# Altium footprint library ParsaLibrary.PcbLib: 526 footprints (part 20 of 33)
Each footprint in its own frame and in the unit in brackets; x right, y up, seen from the top. Pads: shape width x height; smd on the part's side, far side on the other; paste and mask are expansions set on the pad; w line width, h text height; cw(c..) or ccw(c..) is an arc to the next point about the centre after c.
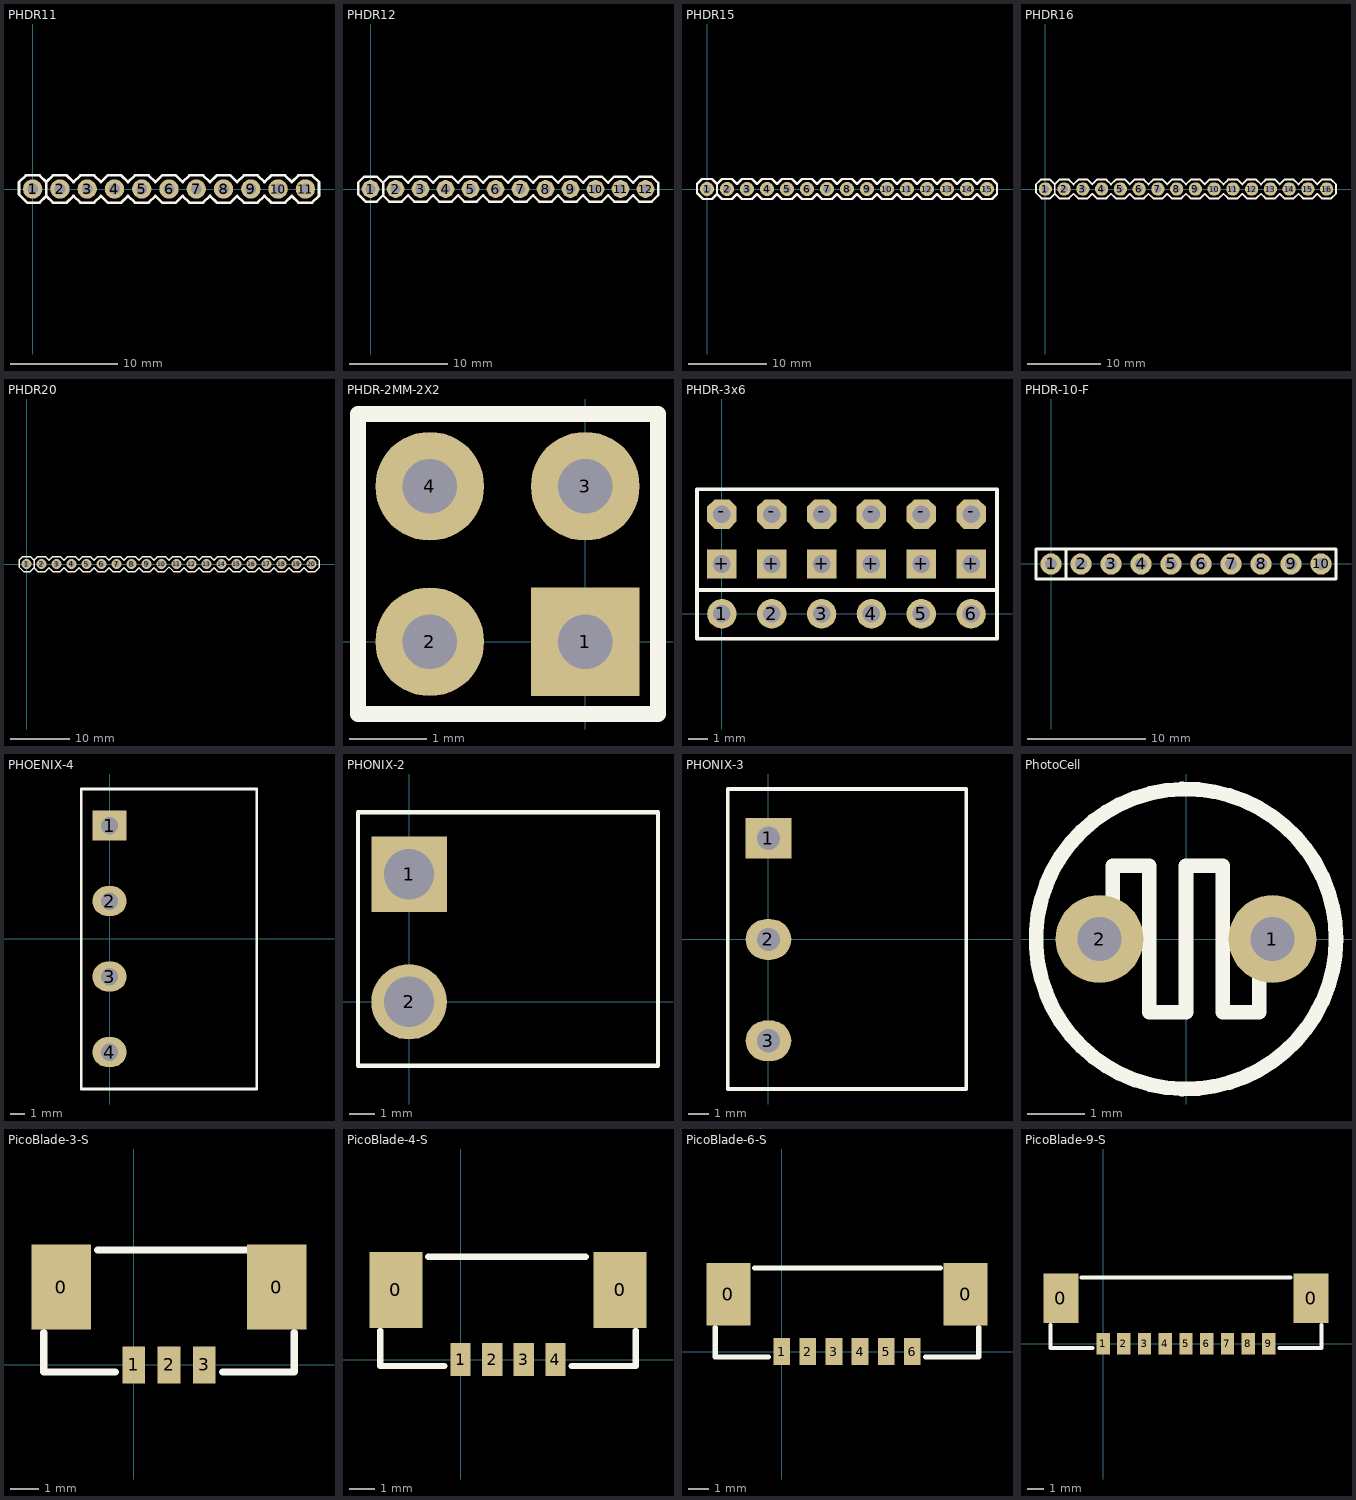
[diagram p19: the footprints below, top view; thin cyan lines are the x and y axes]

## PHDR11 [mm]
pads (11):
  round 1.8 hole 1: 1(0,0) 2(2.54,0) 3(5.08,0) 4(7.62,0) 5(10.16,0) 6(12.7,0) 7(15.24,0) 8(17.78,0) 9(20.32,0) 10(22.86,0) 11(25.4,0)
Top Overlay:
  lines w0.254: 4.572,-1.27 5.715,-1.27 6.35,-0.635 6.985,-1.27 7.62,-1.27 ; 5.08,-1.27 4.445,-1.27 3.81,-0.635 3.175,-1.27 2.54,-1.27 1.905,-1.27 1.27,-0.635 ; 14.732,-1.27 15.875,-1.27 16.51,-0.635 17.145,-1.27 17.78,-1.27 ; 15.24,-1.27 14.605,-1.27 13.97,-0.635 13.335,-1.27 12.7,-1.27 ; 1.27,-0.635 0.635,-1.27 -0.508,-1.27 -1.27,-0.508 -1.27,0.635 -0.635,1.27 0.635,1.27 1.27,0.635 ; 1.27,-0.635 1.27,0.635 ; 1.27,0.635 1.905,1.27 3.175,1.27 3.81,0.635 4.445,1.27 5.715,1.27 6.35,0.635 6.985,1.27 8.255,1.27 8.89,0.635 9.525,1.27 10.795,1.27 11.43,0.635 12.065,1.27 13.335,1.27 13.97,0.635 14.605,1.27 15.875,1.27 16.51,0.635 17.145,1.27 18.415,1.27 19.05,0.635 19.685,1.27 20.955,1.27 21.59,0.635 22.225,1.27 23.495,1.27 24.13,0.635 24.765,1.27 26.035,1.27 26.67,0.635 26.67,-0.635 26.035,-1.27 25.4,-1.27 24.765,-1.27 24.13,-0.635 23.495,-1.27 22.86,-1.27 22.225,-1.27 21.59,-0.635 20.955,-1.27 20.32,-1.27 19.685,-1.27 19.05,-0.635 18.415,-1.27 ; 7.62,-1.27 8.255,-1.27 ; 7.62,-1.27 8.255,-1.27 ; 8.255,-1.27 8.89,-0.635 9.525,-1.27 10.16,-1.27 10.795,-1.27 11.43,-0.635 12.065,-1.27 ; 12.065,-1.27 12.7,-1.27 ; 12.065,-1.27 12.7,-1.27 ; 17.78,-1.27 18.415,-1.27 ; 17.78,-1.27 18.415,-1.27
3D body "2pinheader.STEP": height 0.84, standoff -10.08, extent 19.05,-1.27 24.13,1.27
3D body "2pinheader.STEP": height 0.84, standoff -10.08, extent 13.97,-1.27 19.05,1.27
3D body "2pinheader.STEP": height 0.84, standoff -10.08, extent 8.89,-1.27 13.97,1.27
3D body "2pinheader.STEP": height 0.84, standoff -10.08, extent 3.81,-1.27 8.89,1.27
3D body "2pinheader.STEP": height 0.74, standoff -10.18, extent -1.27,-1.27 3.81,1.27
3D body "2pinheader.STEP": height 0.84, standoff -10.08, extent 21.59,-1.27 26.67,1.27

## PHDR12 [mm]
pads (12):
  round 1.8 hole 1: 1(0,0) 2(2.54,0) 3(5.08,0) 4(7.62,0) 5(10.16,0) 6(12.7,0) 7(15.24,0) 8(17.78,0) 9(20.32,0) 10(22.86,0) 11(25.4,0) 12(27.94,0)
Top Overlay:
  lines w0.254: 4.572,-1.27 5.715,-1.27 6.35,-0.635 6.985,-1.27 7.62,-1.27 ; 5.08,-1.27 4.445,-1.27 3.81,-0.635 3.175,-1.27 2.54,-1.27 1.905,-1.27 1.27,-0.635 ; 14.732,-1.27 15.875,-1.27 16.51,-0.635 17.145,-1.27 17.78,-1.27 ; 15.24,-1.27 14.605,-1.27 13.97,-0.635 13.335,-1.27 12.7,-1.27 ; 1.27,-0.635 1.27,0.635 ; 1.27,-0.635 0.635,-1.27 -0.508,-1.27 -1.27,-0.508 -1.27,0.635 -0.635,1.27 0.635,1.27 1.27,0.635 ; 1.27,0.635 1.905,1.27 3.175,1.27 3.81,0.635 4.445,1.27 5.715,1.27 6.35,0.635 6.985,1.27 8.255,1.27 8.89,0.635 9.525,1.27 10.795,1.27 11.43,0.635 12.065,1.27 13.335,1.27 13.97,0.635 14.605,1.27 15.875,1.27 16.51,0.635 17.145,1.27 18.415,1.27 19.05,0.635 19.685,1.27 20.955,1.27 21.59,0.635 22.225,1.27 23.495,1.27 24.13,0.635 24.765,1.27 26.035,1.27 26.67,0.635 27.305,1.27 28.575,1.27 29.21,0.635 29.21,-0.635 28.575,-1.27 27.94,-1.27 27.305,-1.27 26.67,-0.635 26.035,-1.27 25.4,-1.27 24.765,-1.27 24.13,-0.635 23.495,-1.27 22.86,-1.27 22.225,-1.27 21.59,-0.635 20.955,-1.27 20.32,-1.27 19.685,-1.27 19.05,-0.635 18.415,-1.27 ; 7.62,-1.27 8.255,-1.27 ; 7.62,-1.27 8.255,-1.27 ; 8.255,-1.27 8.89,-0.635 9.525,-1.27 10.16,-1.27 10.795,-1.27 11.43,-0.635 12.065,-1.27 ; 12.065,-1.27 12.7,-1.27 ; 12.065,-1.27 12.7,-1.27 ; 17.78,-1.27 18.415,-1.27 ; 17.78,-1.27 18.415,-1.27
3D body "2pinheader.STEP": height 0.84, standoff -10.08, extent 24.13,-1.27 29.21,1.27
3D body "2pinheader.STEP": height 0.74, standoff -10.18, extent -1.27,-1.27 3.81,1.27
3D body "2pinheader.STEP": height 0.84, standoff -10.08, extent 3.81,-1.27 8.89,1.27
3D body "2pinheader.STEP": height 0.84, standoff -10.08, extent 8.89,-1.27 13.97,1.27
3D body "2pinheader.STEP": height 0.84, standoff -10.08, extent 13.97,-1.27 19.05,1.27
3D body "2pinheader.STEP": height 0.84, standoff -10.08, extent 19.05,-1.27 24.13,1.27

## PHDR15 [mm]
pads (15):
  round 1.8 hole 1: 1(0,0) 2(2.54,0) 3(5.08,0) 4(7.62,0) 5(10.16,0) 6(12.7,0) 7(15.24,0) 8(17.78,0) 9(20.32,0) 10(22.86,0) 11(25.4,0) 12(27.94,0) 13(30.48,0) 14(33.02,0) 15(35.56,0)
Top Overlay:
  lines w0.254: 4.572,-1.27 5.715,-1.27 6.35,-0.635 6.985,-1.27 7.62,-1.27 ; 5.08,-1.27 4.445,-1.27 3.81,-0.635 3.175,-1.27 2.54,-1.27 1.905,-1.27 1.27,-0.635 ; 14.732,-1.27 15.875,-1.27 16.51,-0.635 17.145,-1.27 17.78,-1.27 ; 15.24,-1.27 14.605,-1.27 13.97,-0.635 13.335,-1.27 12.7,-1.27 ; 29.972,-1.27 31.115,-1.27 31.75,-0.635 32.385,-1.27 33.02,-1.27 ; 30.48,-1.27 29.845,-1.27 29.21,-0.635 28.575,-1.27 27.94,-1.27 27.305,-1.27 26.67,-0.635 26.035,-1.27 25.4,-1.27 24.765,-1.27 24.13,-0.635 23.495,-1.27 22.86,-1.27 22.225,-1.27 21.59,-0.635 20.955,-1.27 20.32,-1.27 19.685,-1.27 19.05,-0.635 18.415,-1.27 ; 1.27,-0.635 0.635,-1.27 -0.508,-1.27 -1.27,-0.508 -1.27,0.635 -0.635,1.27 0.635,1.27 1.27,0.635 ; 1.27,-0.635 1.27,0.635 ; 1.27,0.635 1.905,1.27 3.175,1.27 3.81,0.635 4.445,1.27 5.715,1.27 6.35,0.635 6.985,1.27 8.255,1.27 8.89,0.635 9.525,1.27 10.795,1.27 11.43,0.635 12.065,1.27 13.335,1.27 13.97,0.635 14.605,1.27 15.875,1.27 16.51,0.635 17.145,1.27 18.415,1.27 19.05,0.635 19.685,1.27 20.955,1.27 21.59,0.635 22.225,1.27 23.495,1.27 24.13,0.635 24.765,1.27 26.035,1.27 26.67,0.635 27.305,1.27 28.575,1.27 29.21,0.635 29.845,1.27 31.115,1.27 31.75,0.635 32.385,1.27 33.655,1.27 34.29,0.635 34.925,1.27 36.195,1.27 36.83,0.635 36.83,-0.635 36.195,-1.27 35.56,-1.27 34.925,-1.27 34.29,-0.635 33.655,-1.27 ; 7.62,-1.27 8.255,-1.27 ; 7.62,-1.27 8.255,-1.27 ; 8.255,-1.27 8.89,-0.635 9.525,-1.27 10.16,-1.27 10.795,-1.27 11.43,-0.635 12.065,-1.27 ; 12.065,-1.27 12.7,-1.27 ; 12.065,-1.27 12.7,-1.27 ; 17.78,-1.27 18.415,-1.27 ; 17.78,-1.27 18.415,-1.27 ; 33.02,-1.27 33.655,-1.27 ; 33.02,-1.27 33.655,-1.27
3D body "2pinheader.STEP": height 0.84, standoff -10.08, extent 29.21,-1.27 34.29,1.27
3D body "2pinheader.STEP": height 0.84, standoff -10.08, extent 31.75,-1.27 36.83,1.27
3D body "2pinheader.STEP": height 0.84, standoff -10.08, extent 19.05,-1.27 24.13,1.27
3D body "2pinheader.STEP": height 0.84, standoff -10.08, extent 13.97,-1.27 19.05,1.27
3D body "2pinheader.STEP": height 0.84, standoff -10.08, extent 8.89,-1.27 13.97,1.27
3D body "2pinheader.STEP": height 0.84, standoff -10.08, extent 3.81,-1.27 8.89,1.27
3D body "2pinheader.STEP": height 0.74, standoff -10.18, extent -1.27,-1.27 3.81,1.27
3D body "2pinheader.STEP": height 0.84, standoff -10.08, extent 24.13,-1.27 29.21,1.27

## PHDR16 [mm]
pads (16):
  round 1.8 hole 1: 1(0,0) 2(2.54,0) 3(5.08,0) 4(7.62,0) 5(10.16,0) 6(12.7,0) 7(15.24,0) 8(17.78,0) 9(20.32,0) 10(22.86,0) 11(25.4,0) 12(27.94,0) 13(30.48,0) 14(33.02,0) 15(35.56,0) 16(38.1,0)
Top Overlay:
  lines w0.254: 4.572,-1.27 5.715,-1.27 6.35,-0.635 6.985,-1.27 7.62,-1.27 ; 5.08,-1.27 4.445,-1.27 3.81,-0.635 3.175,-1.27 2.54,-1.27 1.905,-1.27 1.27,-0.635 ; 14.732,-1.27 15.875,-1.27 16.51,-0.635 17.145,-1.27 17.78,-1.27 ; 15.24,-1.27 14.605,-1.27 13.97,-0.635 13.335,-1.27 12.7,-1.27 ; 29.972,-1.27 31.115,-1.27 31.75,-0.635 32.385,-1.27 33.02,-1.27 ; 30.48,-1.27 29.845,-1.27 29.21,-0.635 28.575,-1.27 27.94,-1.27 27.305,-1.27 26.67,-0.635 26.035,-1.27 25.4,-1.27 24.765,-1.27 24.13,-0.635 23.495,-1.27 22.86,-1.27 22.225,-1.27 21.59,-0.635 20.955,-1.27 20.32,-1.27 19.685,-1.27 19.05,-0.635 18.415,-1.27 ; 1.27,-0.635 1.27,0.635 ; 1.27,-0.635 0.635,-1.27 -0.508,-1.27 -1.27,-0.508 -1.27,0.635 -0.635,1.27 0.635,1.27 1.27,0.635 ; 1.27,0.635 1.905,1.27 3.175,1.27 3.81,0.635 4.445,1.27 5.715,1.27 6.35,0.635 6.985,1.27 8.255,1.27 8.89,0.635 9.525,1.27 10.795,1.27 11.43,0.635 12.065,1.27 13.335,1.27 13.97,0.635 14.605,1.27 15.875,1.27 16.51,0.635 17.145,1.27 18.415,1.27 19.05,0.635 19.685,1.27 20.955,1.27 21.59,0.635 22.225,1.27 23.495,1.27 24.13,0.635 24.765,1.27 26.035,1.27 26.67,0.635 27.305,1.27 28.575,1.27 29.21,0.635 29.845,1.27 31.115,1.27 31.75,0.635 32.385,1.27 33.655,1.27 34.29,0.635 34.925,1.27 36.195,1.27 36.83,0.635 37.465,1.27 38.735,1.27 39.37,0.635 39.37,-0.635 38.735,-1.27 38.1,-1.27 37.465,-1.27 36.83,-0.635 36.195,-1.27 35.56,-1.27 34.925,-1.27 34.29,-0.635 33.655,-1.27 ; 7.62,-1.27 8.255,-1.27 ; 7.62,-1.27 8.255,-1.27 ; 8.255,-1.27 8.89,-0.635 9.525,-1.27 10.16,-1.27 10.795,-1.27 11.43,-0.635 12.065,-1.27 ; 12.065,-1.27 12.7,-1.27 ; 12.065,-1.27 12.7,-1.27 ; 17.78,-1.27 18.415,-1.27 ; 17.78,-1.27 18.415,-1.27 ; 33.02,-1.27 33.655,-1.27 ; 33.02,-1.27 33.655,-1.27
3D body "2pinheader.STEP": height 0.84, standoff -10.08, extent 24.13,-1.27 29.21,1.27
3D body "2pinheader.STEP": height 0.74, standoff -10.18, extent -1.27,-1.27 3.81,1.27
3D body "2pinheader.STEP": height 0.84, standoff -10.08, extent 3.81,-1.27 8.89,1.27
3D body "2pinheader.STEP": height 0.84, standoff -10.08, extent 8.89,-1.27 13.97,1.27
3D body "2pinheader.STEP": height 0.84, standoff -10.08, extent 13.97,-1.27 19.05,1.27
3D body "2pinheader.STEP": height 0.84, standoff -10.08, extent 19.05,-1.27 24.13,1.27
3D body "2pinheader.STEP": height 0.84, standoff -10.08, extent 34.29,-1.27 39.37,1.27
3D body "2pinheader.STEP": height 0.84, standoff -10.08, extent 29.21,-1.27 34.29,1.27

## PHDR20 [mm]
pads (20):
  round 1.7 hole 1: 1(0,0) 2(2.54,0) 3(5.08,0) 4(7.62,0) 5(10.16,0) 6(12.7,0) 7(15.24,0) 8(17.78,0) 9(20.32,0) 10(22.86,0) 11(25.4,0) 12(27.94,0) 13(30.48,0) 14(33.02,0) 15(35.56,0) 16(38.1,0) 17(40.64,0) 18(43.18,0) 19(45.72,0) 20(48.26,0)
Top Overlay:
  lines w0.254: 4.572,-1.27 5.715,-1.27 6.35,-0.635 6.985,-1.27 7.62,-1.27 ; 5.08,-1.27 4.445,-1.27 3.81,-0.635 3.175,-1.27 2.54,-1.27 1.905,-1.27 1.27,-0.635 ; 14.732,-1.27 15.875,-1.27 16.51,-0.635 17.145,-1.27 17.78,-1.27 ; 15.24,-1.27 14.605,-1.27 13.97,-0.635 13.335,-1.27 12.7,-1.27 ; 29.972,-1.27 31.115,-1.27 31.75,-0.635 32.385,-1.27 33.02,-1.27 ; 30.48,-1.27 29.845,-1.27 29.21,-0.635 28.575,-1.27 27.94,-1.27 27.305,-1.27 26.67,-0.635 26.035,-1.27 24.892,-1.27 24.13,-0.508 23.368,-1.27 22.86,-1.27 22.225,-1.27 21.59,-0.635 20.955,-1.27 20.32,-1.27 19.685,-1.27 19.05,-0.635 18.415,-1.27 ; 40.132,-1.27 41.275,-1.27 41.91,-0.635 42.545,-1.27 43.18,-1.27 ; 40.64,-1.27 40.005,-1.27 39.37,-0.635 38.735,-1.27 38.1,-1.27 ; 1.27,-0.635 1.27,0.635 ; 1.27,-0.635 0.635,-1.27 -0.508,-1.27 -1.27,-0.508 -1.27,0.635 -0.635,1.27 0.635,1.27 1.27,0.635 ; 1.27,0.635 1.905,1.27 3.175,1.27 3.81,0.635 4.445,1.27 5.715,1.27 6.35,0.635 6.985,1.27 8.255,1.27 8.89,0.635 9.525,1.27 10.795,1.27 11.43,0.635 12.065,1.27 13.335,1.27 13.97,0.635 14.605,1.27 15.875,1.27 16.51,0.635 17.145,1.27 18.415,1.27 19.05,0.635 19.685,1.27 20.955,1.27 21.59,0.635 22.225,1.27 23.495,1.27 24.13,0.635 24.765,1.27 26.035,1.27 26.67,0.635 27.305,1.27 28.575,1.27 29.21,0.635 29.845,1.27 31.115,1.27 31.75,0.635 32.385,1.27 33.655,1.27 34.29,0.635 34.925,1.27 36.195,1.27 36.83,0.635 37.465,1.27 38.735,1.27 39.37,0.635 40.005,1.27 41.275,1.27 41.91,0.635 42.545,1.27 43.815,1.27 44.45,0.635 45.085,1.27 46.355,1.27 46.99,0.635 47.625,1.27 48.895,1.27 49.53,0.635 49.53,-0.635 48.895,-1.27 48.26,-1.27 47.625,-1.27 46.99,-0.635 46.355,-1.27 45.72,-1.27 45.085,-1.27 44.45,-0.635 43.815,-1.27 ; 7.62,-1.27 8.255,-1.27 ; 7.62,-1.27 8.255,-1.27 ; 8.255,-1.27 8.89,-0.635 9.525,-1.27 10.16,-1.27 10.795,-1.27 11.43,-0.635 12.065,-1.27 ; 12.065,-1.27 12.7,-1.27 ; 12.065,-1.27 12.7,-1.27 ; 17.78,-1.27 18.415,-1.27 ; 17.78,-1.27 18.415,-1.27 ; 33.02,-1.27 33.655,-1.27 ; 33.02,-1.27 33.655,-1.27 ; 33.655,-1.27 34.29,-0.635 34.925,-1.27 35.56,-1.27 36.195,-1.27 36.83,-0.635 37.465,-1.27 ; 37.465,-1.27 38.1,-1.27 ; 37.465,-1.27 38.1,-1.27 ; 43.18,-1.27 43.815,-1.27 ; 43.18,-1.27 43.815,-1.27
3D body "2pinheader.STEP": height 0.84, standoff -10.08, extent 44.427,-1.27 49.507,1.27
3D body "2pinheader.STEP": height 0.84, standoff -10.08, extent 39.347,-1.27 44.427,1.27
3D body "2pinheader.STEP": height 0.84, standoff -10.08, extent 34.267,-1.27 39.347,1.27
3D body "2pinheader.STEP": height 0.84, standoff -10.08, extent 29.187,-1.27 34.267,1.27
3D body "2pinheader.STEP": height 0.84, standoff -10.08, extent 24.107,-1.27 29.187,1.27
3D body "2pinheader.STEP": height 0.84, standoff -10.08, extent 19.027,-1.27 24.107,1.27
3D body "2pinheader.STEP": height 0.84, standoff -10.08, extent 13.947,-1.27 19.027,1.27
3D body "2pinheader.STEP": height 0.84, standoff -10.08, extent 8.867,-1.27 13.947,1.27
3D body "2pinheader.STEP": height 0.84, standoff -10.08, extent 3.787,-1.27 8.867,1.27
3D body "2pinheader.STEP": height 0.84, standoff -10.08, extent -1.293,-1.27 3.787,1.27

## PHDR-2MM-2X2 [mm]
pads (4):
  rect 1.4x1.4 hole 0.7: 1(0,0)
  round 1.4 hole 0.7: 2(-2,0) 3(0,2) 4(-2,2)
Top Overlay:
  lines w0.2: -2.923,-0.929 0.936,-0.929 0.936,2.929 -2.923,2.929 -2.923,-0.929
  text "." at 0.733,-1.428 h1

## PHDR-3x6 [mm]
pads (18):
  round 1.5 hole 0.9: 1(0,0) 2(2.54,0) 3(5.08,0) 4(7.62,0) 5(10.16,0) 6(12.7,0)
  rect 1.5x1.5 hole 0.9: +(0,2.54) +(2.54,2.54) +(5.08,2.54) +(7.62,2.54) +(10.16,2.54) +(12.7,2.54)
  oct 1.5x1.5 hole 0.9: -(0,5.08) -(2.54,5.08) -(5.08,5.08) -(7.62,5.08) -(10.16,5.08) -(12.7,5.08)
Top Overlay:
  lines w0.2: -1.27,1.219 14.021,1.219 ; -1.27,-1.27 14.021,-1.27 14.021,6.35 -1.27,6.35 -1.27,-1.27

## PHDR-10-F [mm]
pads (10):
  round 1.8 hole 1: 1(0,0) 2(2.54,0) 3(5.08,0) 4(7.62,0) 5(10.16,0) 6(12.7,0) 7(15.24,0) 8(17.78,0) 9(20.32,0) 10(22.86,0)
Top Overlay:
  lines w0.254: 1.25,-1.25 1.25,1.25 ; -1.27,-1.27 0.635,-1.27 24.13,-1.27 24.13,1.27 -1.27,1.27 -1.27,-1.27
3D body "User Library-HeaderRangLuocDonThang2_54mm.step": height 8.5, standoff -3.2, extent -1.3,-1.37 24.1,1.17

## PHOENIX-4 [mil]
pads (4):
  rect 90x80 hole 46: 1(0,300)
  oval 90x80 hole 46: 2(0,100) 3(0,-100) 4(0,-300)
Top Overlay:
  lines w7: -74.8,-397.64 -74.8,397 390,397 390,-397.64 -74.8,-397.64
3D body "User Library-Connector 4 Pins.step": height 669.29, standoff -110.03, extent -70.87,-393.08 796.58,393.08

## PHONIX-2 [mm]
pads (2):
  rect 3x3 hole 2: 1(0,5.08)
  round 3 hole 2: 2(0,0)
Top Overlay:
  lines w0.178: -2.032,7.544 -2.032,-2.54 9.906,-2.54 9.906,7.544 -1.983,7.544
3D body "MSTB 2,5_2_ST_1754449 + MSTB 2,5_ 2_G_1754436 (Phoenix Contact).STEP": height 15.3, standoff -3.34, extent -2.1,-2.5 19.9,7.5

## PHONIX-3 [mil]
pads (3):
  rect 90x80 hole 46: 1(0,200)
  oval 90x80 hole 46: 2(0,0) 3(0,-200)
Top Overlay:
  lines w7: -80,297 -80,-295.05 390,-295.05 390,297 -78.07,297
3D body "MSTB 2,5_3_ST_1754465 + MSTB 2,5_ 3_G_1754452 (Phoenix Contact).STEP": height 606.53, standoff -127.33, extent -78.07,-295.55 788.07,295

## PhotoCell [mil] "PhotoCell"
height 118.11
pads (2):
  round 60 hole 30: 1(59.06,0) 2(-59.06,0)
Top Overlay:
  circle w10: c0,0 r102.44
  lines w10: -50,0 -50,50 -25,50 -25,-50 0,-50 0,50 25,50 25,-50 50,-50 50,0
3D body "User Library-photocell_v8.step": height 82.68, standoff -397.64, extent -100.39,-84.64 100.4,84.65

## PicoBlade-3-S [mm]
pads (5):
  rect 2.1x3 smd: 0(-2.55,2.75) 0(5.05,2.75)
  rect 0.8x1.3 smd: 1(0,0) 2(1.25,0) 3(2.5,0)
Top Overlay:
  lines w0.254: -3.175,1.143 -3.175,-0.254 -0.635,-0.254 ; -1.27,4.064 4.953,4.064 ; 3.135,-0.254 5.675,-0.254 5.675,1.143
3D body "533980371.STEP": height 4.7, standoff 0, extent -3.2,-0.2 5.7,4

## PicoBlade-4-S [mm]
pads (6):
  rect 2.1x3 smd: 0(-2.55,2.75) 0(6.3,2.75)
  rect 0.8x1.3 smd: 1(0,0) 2(1.25,0) 3(2.5,0) 4(3.75,0)
Top Overlay:
  lines w0.254: -3.175,1.143 -3.175,-0.254 -0.635,-0.254 ; -1.27,4.064 4.953,4.064 ; 4.385,-0.254 6.925,-0.254 6.925,1.143
3D body "533980471.STEP": height 4.7, standoff 0, extent -3.175,-0.2 6.975,4

## PicoBlade-6-S [mm]
pads (8):
  rect 2.1x3 smd: 0(-2.55,2.75) 0(8.8,2.75)
  rect 0.8x1.3 smd: 1(0,0) 2(1.25,0) 3(2.5,0) 4(3.75,0) 5(5,0) 6(6.25,0)
Top Overlay:
  lines w0.254: -3.175,1.143 -3.175,-0.254 -0.635,-0.254 ; -1.3,4 7.6,4 ; 6.885,-0.254 9.425,-0.254 9.425,1.143
3D body "533980671.STEP": height 4.7, standoff 0, extent -3.225,-0.2 9.425,4

## PicoBlade-9-S [mm]
pads (11):
  rect 2.1x3 smd: 0(-2.55,2.75) 0(12.55,2.75)
  rect 0.8x1.3 smd: 1(0,0) 2(1.25,0) 3(2.5,0) 4(3.75,0) 5(5,0) 6(6.25,0) 7(7.5,0) 8(8.75,0) 9(10,0)
Top Overlay:
  lines w0.254: -3.175,1.143 -3.175,-0.254 -0.635,-0.254 ; -1.3,4 11.3,4 ; 10.635,-0.254 13.175,-0.254 13.175,1.143
3D body "533980971.STEP": height 4.7, standoff 0, extent -3.2,-0.3 13.2,3.9